# Altium footprint library Lib_Global (1).PcbLib: 60 footprints (part 2 of 4)
Each footprint in its own frame and in the unit in brackets; x right, y up, seen from the top. Pads: shape width x height; smd on the part's side, far side on the other; paste and mask are expansions set on the pad; w line width, h text height; cw(c..) or ccw(c..) is an arc to the next point about the centre after c.
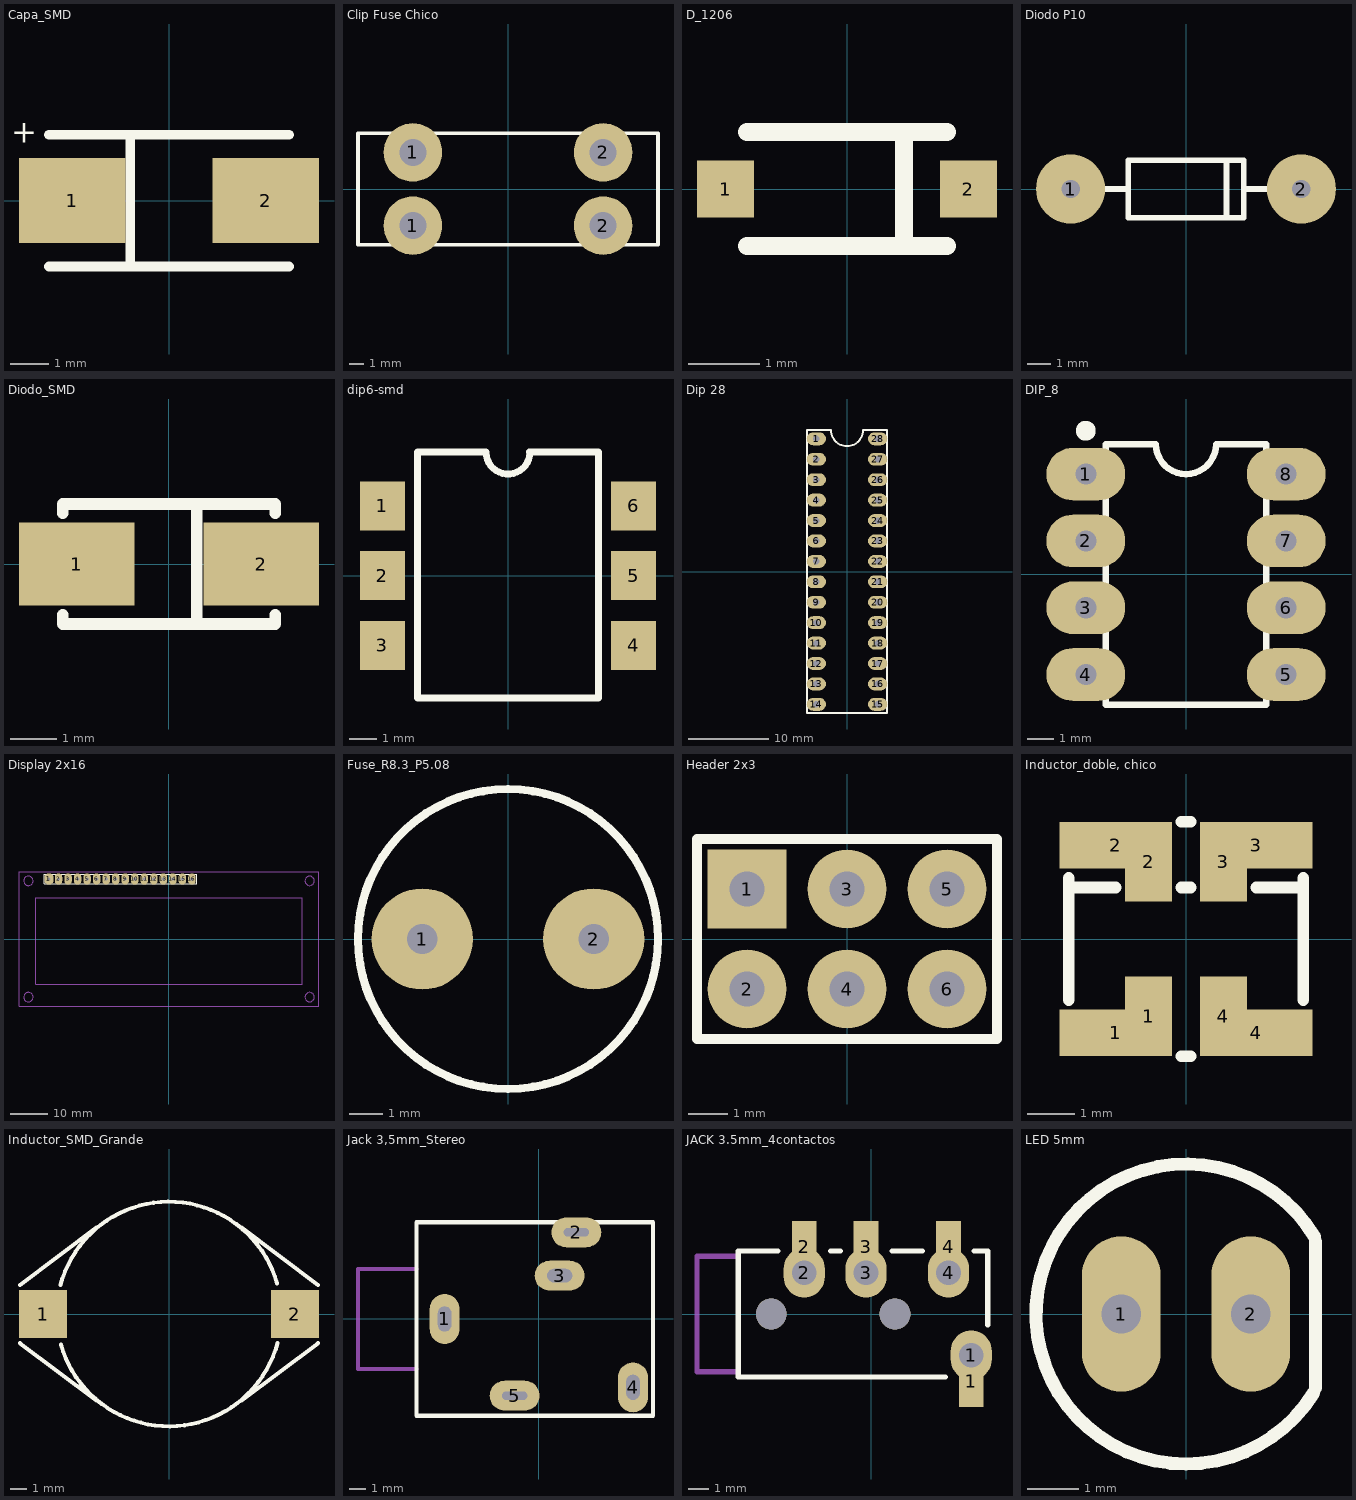
[diagram p1: the footprints below, top view; thin cyan lines are the x and y axes]

## Capa_SMD [mm]
pads (2):
  rect 2.75x2.2 smd: 1(-2.5,0) 2(2.5,0)
Top Overlay:
  lines w0.25: -3.1,-1.7 3.1,-1.7 ; -3.1,1.7 3.1,1.7 ; -1,-1.7 -1,1.7
  text "+" at -3.4,1.3 h1

## Clip Fuse Chico [mm]
pads (4):
  round 4 hole 1.85: 1(-6.5,-2.5) 1(-6.5,2.5) 2(6.5,-2.5) 2(6.5,2.5)
Top Overlay:
  lines w0.25: -10.25,-3.8 -10.25,3.8 10.25,3.8 10.25,-3.8 -10.25,-3.8

## D_1206 [mm]
pads (2):
  rect 0.8x0.8 smd: 1(-1.7,0) 2(1.7,0)
Top Overlay:
  lines w0.25: -1.4,-0.8 1.4,-0.8 ; -1.4,0.8 1.4,0.8 ; 0.8,-0.8 0.8,0.8

## Diodo P10 [mm]
pads (2):
  round 3 hole 0.8: 1(-5,0) 2(5,0)
Top Overlay:
  lines w0.25: -4.5,0 -2.5,0 ; 1.75,-1.25 1.75,1.25 ; 2.5,0 4.5,0 ; -2.5,-1.25 -2.5,1.25 2.5,1.25 2.5,-1.25 -2.5,-1.25
3D body "User Library-Silicone Diode 3_9x1_7.sldprt": height 1.95, standoff -1.78, extent -5.36,-0.95 5.36,0.943

## Diodo_SMD [mm]
pads (2):
  rect 2.5x1.8 smd: 1(-2,0) 2(2,0)
Top Overlay:
  lines w0.25: -2.3,-1.1 -2.3,-1.3 2.3,-1.3 2.3,-1.1 ; -2.3,1.1 -2.3,1.3 2.3,1.3 2.3,1.1 ; 0.6,-1.3 0.6,1.3

## dip6-smd [mm]
pads (6):
  rect 1.65x1.78 smd: 1(-4.57,2.54) 2(-4.57,0) 3(-4.57,-2.54) 4(4.57,-2.54) 5(4.57,0) 6(4.57,2.54)
Top Overlay:
  lines w0.25: 0.775,4.5 3.3,4.5 ; 0.8,4.5 cw(c0,4.5) -0.8,4.5 -3.3,4.5 -3.3,-4.45 3.3,-4.45 3.3,4.45
3D body "User Library-DIP-6-SMD.sldprt": height 3.69, standoff -0.02, extent -4.95,-3.525 4.85,3.725

## Dip 28 [mm]
pads (28):
  oval 2.4x1.6 hole 0.8 mask+0.2: 1(-3.81,16.51) 2(-3.81,13.97) 3(-3.81,11.43) 4(-3.81,8.89) 5(-3.81,6.35) 6(-3.81,3.81) 7(-3.81,1.27) 8(-3.81,-1.27) 9(-3.81,-3.81) 10(-3.81,-6.35) 11(-3.81,-8.89) 12(-3.81,-11.43) 13(-3.81,-13.97) 14(-3.81,-16.51) 15(3.81,-16.51) 16(3.81,-13.97) 17(3.81,-11.43) 18(3.81,-8.89) 19(3.81,-6.35) 20(3.81,-3.81) 21(3.81,-1.27) 22(3.81,1.27) 23(3.81,3.81) 24(3.81,6.35) 25(3.81,8.89) 26(3.81,11.43) 27(3.81,13.97) 28(3.81,16.51)
Top Overlay:
  lines w0.25: -5,-17.6 -5,17.6 -2,17.6 ccw(c0,17.6) 2,17.6 5,17.6 5,-17.6 -5,-17.6
3D body "User Library-28 pin dip-1.sldprt": height 4.65, standoff -1.57, extent -3.937,-17.97 3.937,17.971

## DIP_8 [mm]
pads (8):
  oval 3x2 hole 0.8: 1(-3.81,3.81) 2(-3.81,1.27) 3(-3.81,-1.27) 4(-3.81,-3.81) 5(3.81,-3.81) 6(3.81,-1.27) 7(3.81,1.27) 8(3.81,3.81)
Top Overlay:
  circle w0.5: c-3.81,5.461 r0.127
  lines w0.25: -3.048,-4.953 -3.048,4.953 -1.143,4.953 ccw(c0,4.953) 1.143,4.953 3.048,4.953 3.048,-4.953 -3.048,-4.953
3D body "User Library-DIP-8P-M01.sldprt": height 4.36, standoff -3, extent -3.87,-4.7 4,4.7

## Display 2x16 [mm]
pads (16):
  oval 2.5x3 hole 0.9: 1(-32,16)
  oval 2x3 hole 0.9: 2(-29.46,16) 3(-26.92,16) 4(-24.38,16) 5(-21.84,16) 6(-19.3,16) 7(-16.76,16) 8(-14.22,16) 9(-11.68,16) 10(-9.14,16) 11(-6.6,16) 12(-4.06,16) 13(-1.52,16) 14(1.02,16) 15(3.56,16) 16(6.1,16)
Top Overlay:
  lines w0.25: -33.27,14.73 7.37,14.73 7.37,17.27 -33.27,17.27 -33.27,14.73
Mechanical 15:
  circle w0.25: c-37.5,15.5 r1.25
  circle w0.25: c-37.5,-15.5 r1.25
  circle w0.25: c37.5,15.5 r1.25
  circle w0.25: c37.5,-15.5 r1.25
  lines w0.25: -40,-18 40,-18 40,18 -40,18 -40,-18 ; -35.5,-12 -35.5,11 35.5,11 35.5,-12 -35.5,-12
  text "Hola Mundo" at -20.5,-3.5 h5
3D body "User Library-LCD_1602a.sldprt": height 16.3, standoff 4.9, extent -40.05,-17.5 39.95,18.5
3D body "90120-0136.SLDPRT": height 9.25, standoff -2.87, extent -33.32,14.75 7.32,17.25

## Fuse_R8.3_P5.08 [mm]
pads (2):
  round 3 hole 0.9: 1(-2.54,0) 2(2.54,0)
Top Overlay:
  circle w0.25: c0,0 r4.445
3D body "User Library-260001.sldprt": height 7.9, standoff -3.17, extent -4.124,-4.225 4.326,4.225

## Header 2x3 [mm]
pads (6):
  rect 2x2 hole 0.9: 1(-2.54,1.27)
  round 2 hole 0.9: 2(-2.54,-1.27) 3(0,1.27) 4(0,-1.27) 5(2.54,1.27) 6(2.54,-1.27)
Top Overlay:
  lines w0.25: -3.81,-2.54 -3.81,2.54 3.81,2.54 3.81,-2.54 -3.81,-2.54
3D body "User Library-HEADER, 2X3, 2_54MM X 2_54MM PITCH, VERT, TH.sldprt": height 8.38, standoff -3.81, extent -3.82,-2.54 3.8,2.54

## Inductor_doble, chico [mm]
pads (8):
  rect 2.4x1 smd: 1(-1.5,-2) 2(-1.5,2) 3(1.5,2) 4(1.5,-2)
  rect 1x1.7 smd: 1(-0.8,-1.65) 2(-0.8,1.65) 3(0.8,1.65) 4(0.8,-1.65)
Top Overlay:
  lines w0.25: -2.5,-1.3 -2.5,1.3 ; -2.5,1.1 -1.5,1.1 ; -0.1,-2.5 0.1,-2.5 ; -0.1,1.1 0.1,1.1 ; -0.1,2.5 0.1,2.5 ; 1.5,1.1 2.5,1.1 ; 2.5,-1.3 2.5,1.3

## Inductor_SMD_Grande [mm]
pads (2):
  rect 3x3 smd: 1(-7.85,0) 2(7.85,0)
Top Overlay:
  lines w0.25: -9.3,-1.816 -4.5,-5.4 ; -9.3,1.8 -4.5,5.4 ; -6.76,1.816 cw(c0,0) 6.734,1.91 ; -6.734,-1.91 ccw(c0,0) 6.76,-1.816 ; 4.5,-5.4 9.3,-1.816 ; 4.5,5.4 9.3,1.8

## Jack 3,5mm_Stereo [mm]
pads (5):
  oval 1.8x3 hole 0.8 slot 1.5 at 90 deg: 1(-5.65,0) 4(5.65,-4.1)
  oval 3x1.8 hole 0.5 slot 1.5 at 0 deg: 2(2.25,5.2) 5(-1.45,-4.6)
  oval 3x1.8 hole 0.8 slot 1.5 at 0 deg: 3(1.25,2.6)
Top Overlay:
  lines w0.25: -7.35,-5.8 -7.35,5.8 6.85,5.8 6.85,-5.8 -7.35,-5.8
Mechanical 15:
  lines w0.25: -7.35,-3 -10.85,-3 -10.85,3 -7.35,3
3D body: height 6.15, standoff 0.15, extent -10.85,-3 -7.35,3
3D body: height 0.25, standoff 0, extent -7.35,-3 -7.35,-3
3D body: height 6.3, standoff 0, extent -7.325,-5.8 6.875,5.8
3D body: height 6.36, standoff -6.36, extent -1.6,0.4 -1.6,0.4

## JACK 3.5mm_4contactos [mm]
pads (10):
  rect 1.2x2.5 smd: 1(4.85,-3.25) 2(-3.25,3.25) 3(-0.25,3.25) 4(3.75,3.25)
  oval 2x2.4 hole 1.2: 1(4.85,-2) 2(-3.25,2) 3(-0.25,2) 4(3.75,2)
  round 1.5 hole 1.5: ""(-4.85,0) ""(1.15,0)
Top Overlay:
  lines w0.25: -6.45,3.05 -6.45,-3.05 3.6,-3.05 ; -6.425,3.05 -4.525,3.05 ; -1.975,3.05 -1.5,3.05 ; 1,3.05 2.475,3.05 ; 5,3.05 5.65,3.05 5.65,-0.525
Mechanical 15:
  lines w0.25: -6.45,-2.8 -8.45,-2.8 -8.45,2.8 -6.45,2.8
3D body "User Library-3_5mm_Audio_Jack.sldprt": height 5.05, standoff -0.85, extent -8.55,-4.6 5.75,4.55

## LED 5mm [mm]
pads (2):
  oval 1.524x3 hole 0.762: 1(-1.25,0) 2(1.25,0)
Top Overlay:
  lines w0.254: 2.462,-1.524 cw(c0,0) 2.483,1.49 ; 2.5,-1.425 2.5,1.4
3D body "User Library-LED 5MM-1.sldprt": height 9.13, standoff -19.57, extent -2.975,-2.973 2.64,2.973